# Altium footprint library mastermind.PCBLIB: 1061 footprints (part 16 of 67)
Each footprint in its own frame and in the unit in brackets; x right, y up, seen from the top. Pads: shape width x height; smd on the part's side, far side on the other; paste and mask are expansions set on the pad; w line width, h text height; cw(c..) or ccw(c..) is an arc to the next point about the centre after c.
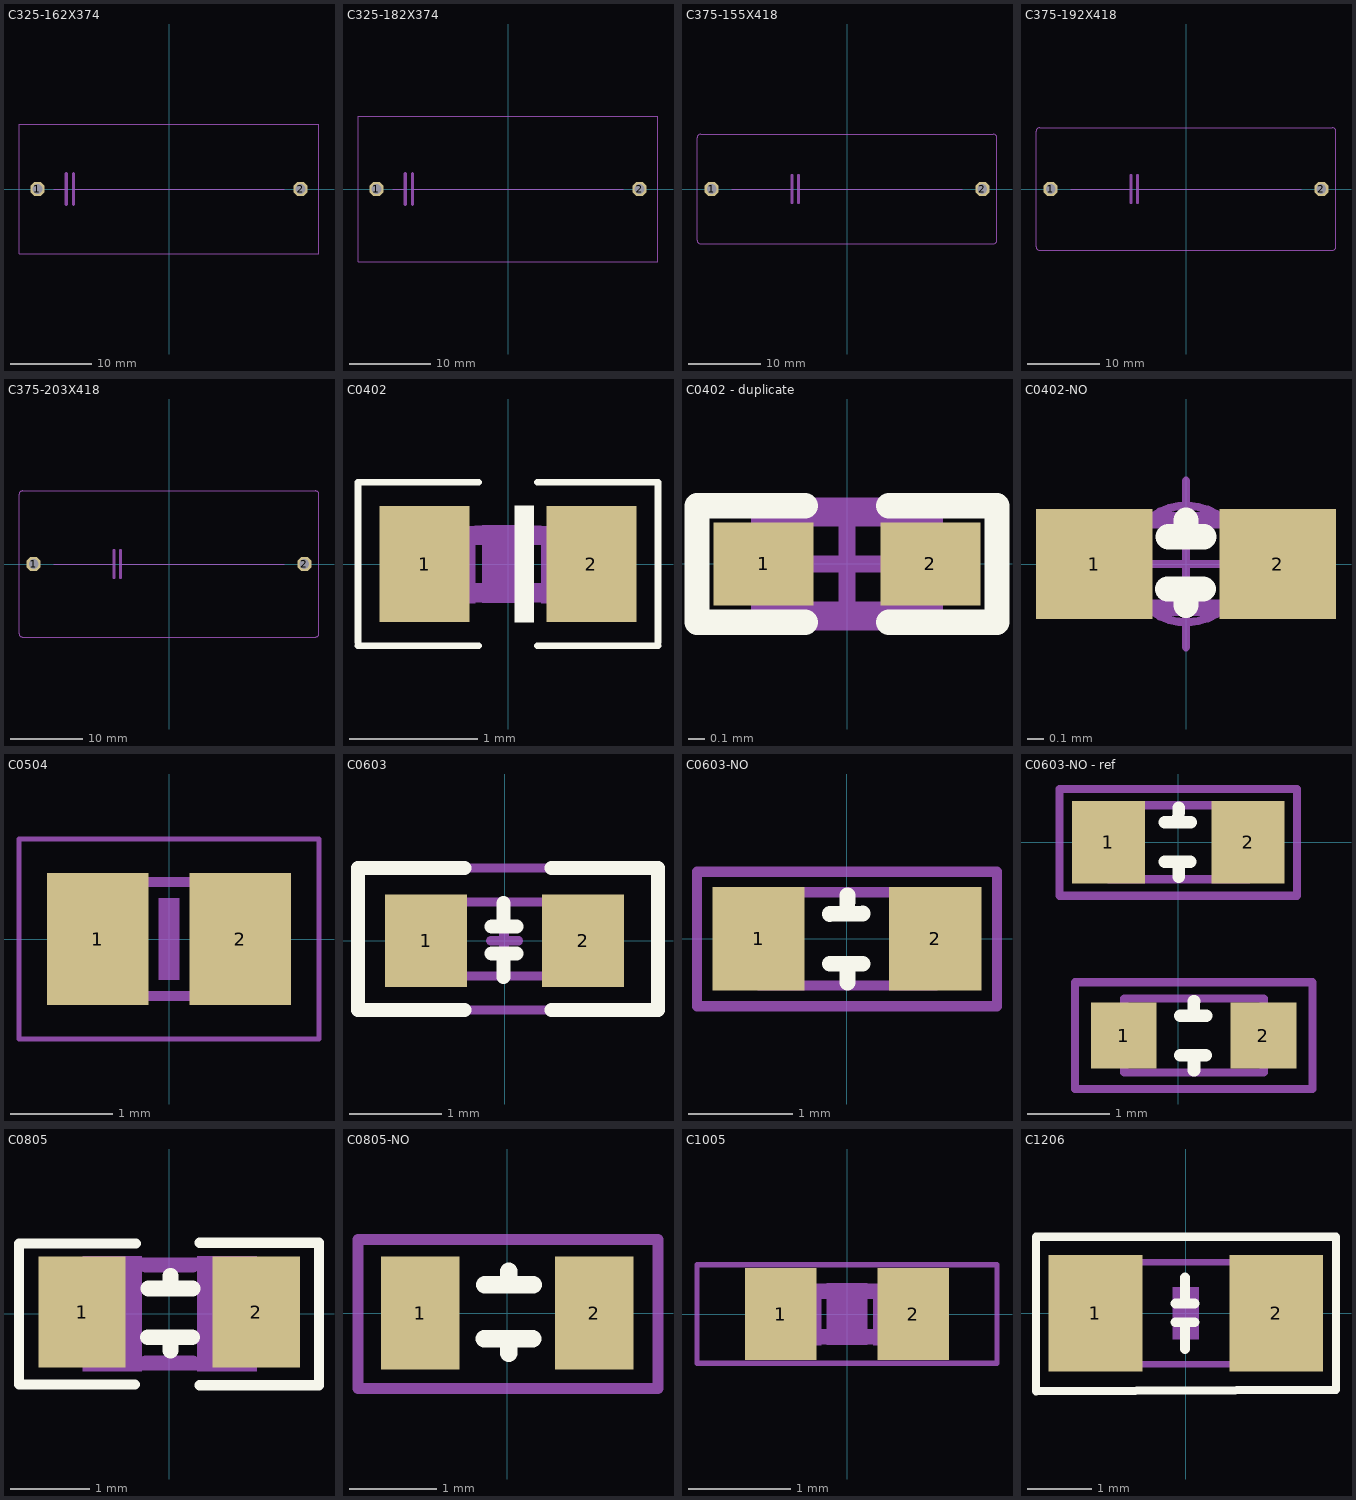
[diagram p15: the footprints below, top view; thin cyan lines are the x and y axes]

## C325-162X374 [mil]
pads (2):
  oct 68.26x68.26 hole 47: 1(-640,0) 2(640,0)
Mechanical 2:
  lines w6: -562,0 -500,0 ; -465,0 562,0 ; -730,-315 -730,315 730,315 730,-315 -730,-315
  lines w16: -500,-75 -500,0 -500,75 ; -465,-75 -465,0 -465,75

## C325-182X374 [mil]
pads (2):
  oct 68.26x68.26 hole 47: 1(-640,0) 2(640,0)
Mechanical 2:
  lines w6: -562,0 -500,0 ; -465,0 562,0 ; -730,-355 730,-355 730,355 -730,355 -730,-355
  lines w16: -500,-75 -500,0 -500,75 ; -465,-75 -465,0 -465,75

## C375-155X418 [mil]
pads (2):
  oct 75.52x75.52 hole 52: 1(-740,0) 2(740,0)
Mechanical 2:
  lines w6: -630,0 -300,0 ; -265,0 630,0 ; -820,-280 ccw(c-800,-280) -800,-300 800,-300 ccw(c800,-280) 820,-280 820,280 ccw(c800,280) 800,300 -800,300 ccw(c-800,280) -820,280 -820,-280
  lines w16: -300,-75 -300,0 -300,75 ; -265,-75 -265,0 -265,75

## C375-192X418 [mil]
pads (2):
  oct 75.52x75.52 hole 52: 1(-740,0) 2(740,0)
Mechanical 2:
  lines w6: -630,0 -300,0 ; -265,0 630,0 ; -820,-315 ccw(c-800,-315) -800,-335 800,-335 ccw(c800,-315) 820,-315 820,315 ccw(c800,315) 800,335 -800,335 ccw(c-800,315) -820,315 -820,-315
  lines w16: -300,-75 -300,0 -300,75 ; -265,-75 -265,0 -265,75

## C375-203X418 [mil]
pads (2):
  oct 75.52x75.52 hole 52: 1(-740,0) 2(740,0)
Mechanical 2:
  lines w6: -630,0 -300,0 ; -265,0 630,0 ; -820,-380 ccw(c-800,-380) -800,-400 800,-400 ccw(c800,-380) 820,-380 820,380 ccw(c800,380) 800,400 -800,400 ccw(c-800,380) -820,380 -820,-380
  lines w16: -300,-75 -300,0 -300,75 ; -265,-75 -265,0 -265,75

## C0402 [mm]
pads (2):
  rect 0.7x0.9 smd: 1(-0.65,0) 2(0.65,0)
Top Overlay:
  rectangle: 0.051,-0.457 0.203,0.457
  lines w0.051: -1.168,-0.635 -0.229,-0.635 ; -1.168,-0.61 -1.168,0.635 -0.229,0.635 ; 0.229,-0.635 1.168,-0.635 ; 0.229,0.635 1.168,0.635 1.168,-0.61
Mechanical 8:
  region: 0.259,-0.305 0.259,0.295 0.559,0.295 0.559,-0.305
  region: -0.554,-0.305 -0.554,0.295 -0.254,0.295 -0.254,-0.305
  lines w0.152: -0.245,-0.224 0.245,-0.224 ; -0.245,0.224 0.245,0.224
Mechanical 30:
  region: -0.2,-0.3 -0.2,0.3 0.2,0.3 0.2,-0.3

## C0402 - duplicate [mm]
pads (2):
  rect 0.6x0.5 smd: 1(-0.5,0) 2(0.5,0)
Top Overlay:
  lines w0.152: -0.25,-0.35 -0.9,-0.35 -0.9,0.35 -0.25,0.35 ; 0.25,-0.35 0.9,-0.35 0.9,0.35 0.25,0.35
Mechanical 13:
  lines w0.1: -0.525,-0.275 -0.525,0.275 0.525,0.275 0.525,-0.275 -0.525,-0.275
Mechanical 15:
  lines w0.1: -0.275,0 0.275,0 ; 0,-0.275 0,0.275 ; -0.9,-0.35 -0.9,0.35 0.9,0.35 0.9,-0.35 -0.9,-0.35
3D body "User Library-0402(1005M) Cap.step": height 0.5, standoff -0.01, extent -0.508,-0.254 0.508,0.254

## C0402-NO [mm]
pads (2):
  rect 0.7x0.66 smd: 1(-0.55,0) 2(0.55,0)
Top Overlay:
  lines w0.152: -0.111,-0.15 0.104,-0.15 ; -0.107,0.164 0.108,0.164 ; 0,-0.247 0,-0.15 ; 0,0.164 0,0.262
Top Component Center:
  circle w0.05: c0,0 r0.35
  lines w0.05: -0.5,0 0.5,0 ; 0,-0.5 0,0.5
Top 3D Body:
  lines w0.001: -0.5,-0.25 0.5,-0.25 0.5,0.25 -0.5,0.25 -0.5,-0.25
Top Dimensions:
  lines w0.1: -0.512,-0.262 0.512,-0.262 0.512,0.262 -0.512,0.262 -0.512,-0.262
Top Assembly:
  text ".Designator" at -1.4,0.88 h0.75
3D body "User Library-CAPC1005X06.step": height 0.6, standoff 0, extent -0.5,-0.25 0.5,0.25

## C0504 [mm]
pads (2):
  rect 1x1.3 smd: 1(-0.7,0) 2(0.7,0)
Mechanical 8:
  region: 0.279,-0.622 0.279,0.628 0.659,0.628 0.659,-0.622
  region: -0.66,-0.622 -0.66,0.628 -0.28,0.628 -0.28,-0.622
  lines w0.102: -0.294,-0.559 0.294,-0.559 ; -0.294,0.559 0.294,0.559
Mechanical 30:
  region: -0.1,-0.4 -0.1,0.4 0.1,0.4 0.1,-0.4
Mechanical 29 (Mech34):
  lines w0.051: -1.473,-0.983 -1.473,0.983 1.473,0.983 1.473,-0.983 -1.473,-0.983

## C0603 [mm]
pads (2):
  rect 0.889x1 smd: 1(-0.85,0) 2(0.85,0)
Top Overlay:
  lines w0.152: -0.433,-0.749 -1.589,-0.749 -1.589,0.787 -0.433,0.787 ; -0.14,-0.14 0.127,-0.14 ; -0.14,0.152 0.127,0.152 ; -0.013,-0.394 -0.013,-0.14 ; -0.013,0.152 -0.013,0.406 ; 0.506,-0.749 1.662,-0.749 1.662,0.787 0.506,0.787
Mechanical 13:
  lines w0.1: -0.15,0 0.15,0 ; 0,-0.15 0,0.15 ; -0.775,-0.381 -0.775,0.419 0.825,0.419 0.825,-0.381 -0.775,-0.381
Mechanical 15:
  lines w0.1: -0.132,0 0.146,0 ; -0.013,-0.116 -0.013,0.087 ; -1.589,-0.749 -1.589,0.787 1.662,0.787 1.662,-0.749 -1.589,-0.749
  text ".Designator" at -1.308,-0.257 h1
3D body "User Library-CapCeramic_Kemet_0603_1608.step": height 0.8, standoff 0, extent -0.775,-0.381 0.825,0.419

## C0603-NO [mm]
height 0.8
pads (2):
  rect 0.889x1 smd mask+0.102: 1(-0.85,0) 2(0.85,0)
Top Overlay:
  lines w0.152: -0.165,-0.24 0.15,-0.24 ; -0.165,0.24 0.153,0.242 ; 0.003,0.248 0.005,0.42 ; 0.005,-0.42 0.005,-0.258
Dimensions:
  lines w0.1: -0.845,-0.45 -0.845,0.45 0.855,0.45 0.855,-0.45 -0.845,-0.45
  text ".Designator" at -0.52,-0.19 h1
Mechanical 15:
  lines w0.1: -1.443,-0.651 -1.443,0.647 1.446,0.647 1.446,-0.651 -1.443,-0.651
3D body "User Library-Chip Capacitor 0603.step": height 0.8, standoff 0, extent -0.795,-0.43 0.805,0.43

## C0603-NO - ref [mm]
height 0.8
pads (4):
  rect 0.889x1 smd mask+0.102: 1(-0.85,0) 2(0.85,0)
  rect 0.8x0.8 smd mask+0.102: 1(-0.663,-2.353) 2(1.037,-2.353)
Top Overlay:
  lines w0.152: -0.165,-0.24 0.15,-0.24 ; -0.165,0.24 0.153,0.242 ; 0.003,0.248 0.005,0.42 ; 0.005,-0.42 0.005,-0.258 ; 0.022,-2.593 0.337,-2.593 ; 0.022,-2.113 0.34,-2.111 ; 0.19,-2.106 0.192,-1.933 ; 0.192,-2.773 0.192,-2.611
Dimensions:
  lines w0.1: -0.845,-0.45 -0.845,0.45 0.855,0.45 0.855,-0.45 -0.845,-0.45 ; -0.658,-2.803 -0.658,-1.903 1.042,-1.903 1.042,-2.803 -0.658,-2.803
  text ".Designator" at -0.333,-2.543 h1
  text ".Designator" at -0.52,-0.19 h1
Mechanical 15:
  lines w0.1: -1.443,-0.651 -1.443,0.647 1.446,0.647 1.446,-0.651 -1.443,-0.651 ; -1.256,-3.004 -1.256,-1.706 1.633,-1.706 1.633,-3.004 -1.256,-3.004
3D body "User Library-Chip Capacitor 0603.step": height 0.8, standoff 0, extent -0.608,-2.783 0.992,-1.923
3D body "User Library-Chip Capacitor 0603.step": height 0.8, standoff 0, extent -0.795,-0.43 0.805,0.43

## C0805 [mm]
pads (2):
  rect 1.1x1.4 smd: 1(-1.098,0.025) 2(1.102,0.025)
Top Overlay:
  lines w0.127: -0.429,-0.892 -1.894,-0.892 -1.894,0.892 -0.418,0.892 ; 0.386,-0.9 1.894,-0.9 1.894,0.899 0.386,0.899
  lines w0.2: -0.263,-0.295 0.292,-0.295 ; -0.259,0.323 0.297,0.323 ; 0.018,-0.46 0.018,-0.302 ; 0.019,0.323 0.019,0.482
Mechanical 8:
  region: 0.356,-0.724 0.356,0.726 1.106,0.726 1.106,-0.724
  region: -1.092,-0.724 -1.092,0.726 -0.342,0.726 -0.342,-0.724
  lines w0.102: -0.381,0.66 0.381,0.66 ; -0.356,-0.66 0.381,-0.66
Mechanical 22:
  lines w0.152: -0.298,-0.6 0.302,-0.6 ; -0.298,0.6 0.302,0.6
3D body "C0805_085.step": height 0.85, standoff 0, extent -0.998,-0.6 1.002,0.65

## C0805-NO [mm]
pads (2):
  rect 0.9x1.3 smd: 1(-1,0) 2(1,0)
Top Overlay:
  lines w0.2: -0.263,-0.295 0.292,-0.295 ; -0.259,0.323 0.297,0.323 ; 0.018,-0.46 0.018,-0.302 ; 0.019,0.323 0.019,0.482
Mechanical 15:
  lines w0.127: -1.715,-0.867 1.731,-0.867 1.731,0.846 -1.715,0.846 -1.715,-0.867
3D body "C0805_085.step": height 0.85, standoff 0, extent -0.998,-0.62 1.002,0.63

## C1005 [mm]
pads (2):
  rect 0.7x0.9 smd: 1(-0.65,0) 2(0.65,0)
Mechanical 8:
  region: -0.554,-0.305 -0.554,0.295 -0.254,0.295 -0.254,-0.305
  region: 0.259,-0.305 0.259,0.295 0.559,0.295 0.559,-0.305
  lines w0.152: -0.245,-0.224 0.245,-0.224 ; -0.245,0.224 0.245,0.224
Mechanical 30:
  region: -0.2,-0.3 -0.2,0.3 0.2,0.3 0.2,-0.3
Mechanical 29 (Mech34):
  lines w0.051: -1.473,-0.483 1.473,-0.483 1.473,0.483 -1.473,0.483 -1.473,-0.483

## C1206 [mm]
pads (2):
  rect 1.45x1.8 smd: 1(-1.4,0) 2(1.4,0)
Top Overlay:
  lines w0.127: 2.322,1.185 2.322,-1.185 -2.32,-1.209 -2.32,1.185 2.322,1.185 ; 2.322,1.185 2.322,1.185
  lines w0.152: -0.163,-0.14 0.137,-0.14 ; -0.163,0.152 0.137,0.152 ; -0.013,-0.554 -0.013,-0.14 ; -0.013,0.152 -0.013,0.553
Mechanical 8:
  region: 0.952,-0.849 0.952,0.851 1.702,0.851 1.702,-0.849
  region: -1.702,-0.851 -1.702,0.849 -0.952,0.849 -0.952,-0.851
  lines w0.102: -0.965,-0.787 0.965,-0.787 ; -0.965,0.787 0.965,0.787
Mechanical 30:
  region: -0.2,-0.4 -0.2,0.4 0.2,0.4 0.2,-0.4
3D body "C1206_145.step": height 1.45, standoff 0, extent -1.603,-0.798 1.597,0.802